# Altium footprint library 7-Connectors-9.PcbLib: 41 footprints (part 2 of 3)
Each footprint in its own frame and in the unit in brackets; x right, y up, seen from the top. Pads: shape width x height; smd on the part's side, far side on the other; paste and mask are expansions set on the pad; w line width, h text height; cw(c..) or ccw(c..) is an arc to the next point about the centre after c.
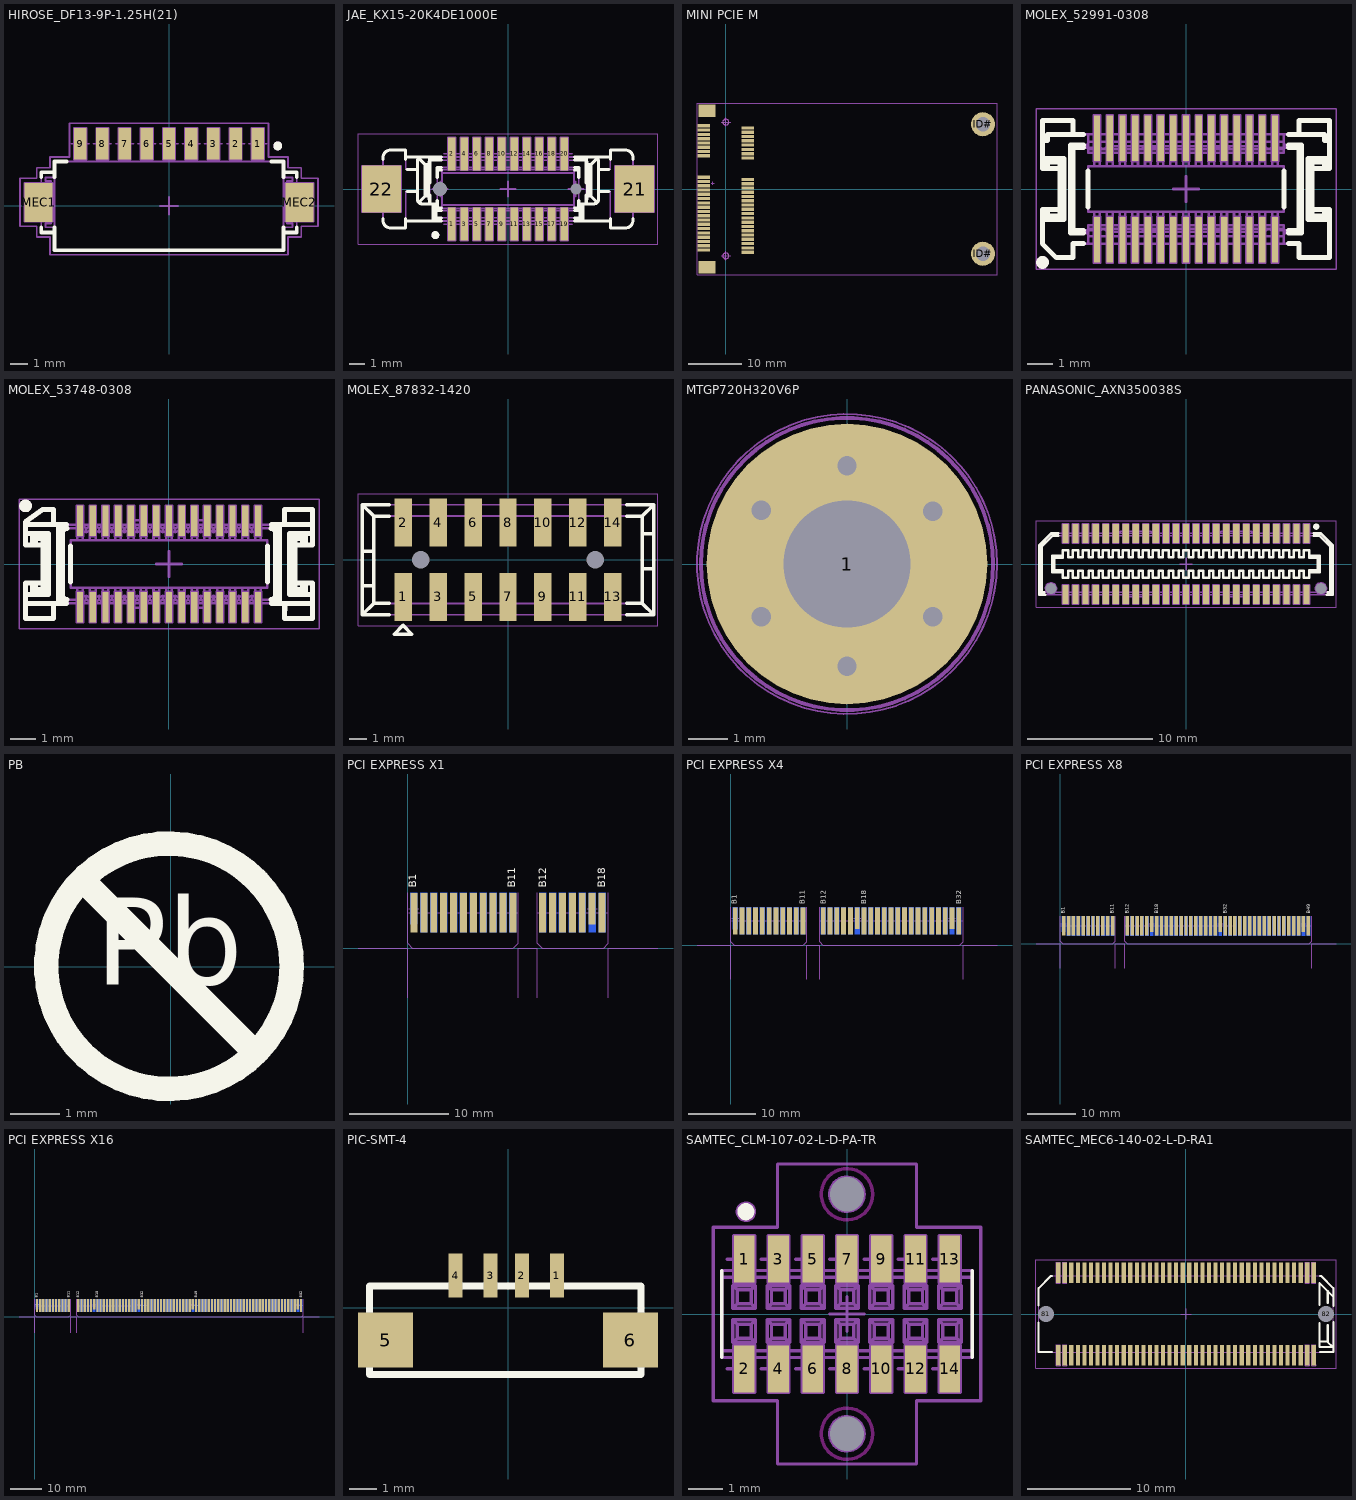
[diagram p1: the footprints below, top view; thin cyan lines are the x and y axes]

## HIROSE_DF13-9P-1.25H(21) [mm] "Pitch 1.25mm, Single Row, 9 Contacts, Right Angle SMT Header, Series DF13"
height 3.6
pads (11):
  rect 0.7x1.8 smd: 1(5,3.5) 2(3.75,3.5) 3(2.5,3.5) 4(1.25,3.5) 5(0,3.5) 6(-1.25,3.5) 7(-2.5,3.5) 8(-3.75,3.5) 9(-5,3.5)
  rect 1.6x2.2 smd: MEC1(-7.35,0.2) MEC2(7.35,0.2)
Top Overlay:
  circle w0.25: c6.125,3.376 r0.125
  lines w0.2: -7.2,-1.2 -7.2,-1.5 -6.45,-1.5 ; -7.2,1.6 -7.2,1.9 -6.45,1.9 ; -6.45,-1.2 -6.45,-2.5 6.45,-2.5 6.45,-1.2 ; -6.45,1.6 -6.45,2.5 -5.75,2.5 ; 5.75,2.5 6.45,2.5 6.45,1.6 ; 6.45,-1.5 7.2,-1.5 7.2,-1.2 ; 6.45,1.9 7.2,1.9 7.2,1.6
Mechanical 8:
  lines w0.1: -7.85,0.2 -7.35,0.2 ; -7.35,-0.3 -7.35,0.2 ; -7.35,0.7 -7.35,0.2 ; -6.85,0.2 -7.35,0.2 ; -5.5,3.5 -5,3.5 ; -5,3 -5,3.5 ; -5,4 -5,3.5 ; -4.5,3.5 -5,3.5 ; -4.25,3.5 -3.75,3.5 ; -3.75,3 -3.75,3.5 ; -3.75,4 -3.75,3.5 ; -3.25,3.5 -3.75,3.5 ; -3,3.5 -2.5,3.5 ; -2.5,3 -2.5,3.5 ; -2.5,4 -2.5,3.5 ; -2,3.5 -2.5,3.5 ; -1.75,3.5 -1.25,3.5 ; -1.25,3 -1.25,3.5 ; -1.25,4 -1.25,3.5 ; -0.75,3.5 -1.25,3.5 ; -0.5,0 0,0 ; -0.5,3.5 0,3.5 ; 0,-0.5 0,0 ; 0,0.5 0,0 ; 0,3 0,3.5 ; 0,4 0,3.5 ; 0.5,0 0,0 ; 0.5,3.5 0,3.5 ; 0.75,3.5 1.25,3.5 ; 1.25,3 1.25,3.5 ; 1.25,4 1.25,3.5 ; 1.75,3.5 1.25,3.5 ; 2,3.5 2.5,3.5 ; 2.5,3 2.5,3.5 ; 2.5,4 2.5,3.5 ; 3,3.5 2.5,3.5 ; 3.25,3.5 3.75,3.5 ; 3.75,3 3.75,3.5 ; 3.75,4 3.75,3.5 ; 4.25,3.5 3.75,3.5 ; 4.5,3.5 5,3.5 ; 5,3 5,3.5 ; 5,4 5,3.5 ; 5.5,3.5 5,3.5 ; 6.85,0.2 7.35,0.2 ; 7.35,-0.3 7.35,0.2 ; 7.35,0.7 7.35,0.2 ; 7.85,0.2 7.35,0.2 ; -8.15,-0.9 -6.55,-0.9 -6.55,1.3 -8.15,1.3 -8.15,-0.9 ; -5.35,2.6 -5.35,4.4 -4.65,4.4 -4.65,2.6 -5.35,2.6 ; -4.1,2.6 -4.1,4.4 -3.4,4.4 -3.4,2.6 -4.1,2.6 ; -2.85,2.6 -2.85,4.4 -2.15,4.4 -2.15,2.6 -2.85,2.6 ; -1.6,2.6 -1.6,4.4 -0.9,4.4 -0.9,2.6 -1.6,2.6 ; -0.35,2.6 -0.35,4.4 0.35,4.4 0.35,2.6 -0.35,2.6 ; 0.9,2.6 0.9,4.4 1.6,4.4 1.6,2.6 0.9,2.6 ; 2.15,2.6 2.15,4.4 2.85,4.4 2.85,2.6 2.15,2.6 ; 3.4,2.6 3.4,4.4 4.1,4.4 4.1,2.6 3.4,2.6 ; 4.65,2.6 4.65,4.4 5.35,4.4 5.35,2.6 4.65,2.6 ; 6.55,-0.9 8.15,-0.9 8.15,1.3 6.55,1.3 6.55,-0.9
Mechanical 14:
  circle w0.25: c6.125,3.376 r0.125
  lines w0.1: -7.2,-0.7 -7.2,-1.5 -6.45,-1.5 ; -7.2,1.1 -7.2,1.9 -6.45,1.9 ; -6.653,1.1 -7.95,1.1 -7.95,-0.7 -6.65,-0.7 ; -6.45,-1.2 -6.95,-1.2 -6.95,-1 -6.65,-1 -6.65,1.4 -6.95,1.4 -6.95,1.6 -6.45,1.6 ; -5.175,2.5 -5.175,3.725 ; -4.825,2.5 -4.825,3.725 ; -3.925,2.5 -3.925,3.725 ; -3.575,2.5 -3.575,3.725 ; -2.675,2.5 -2.675,3.725 ; -2.325,2.5 -2.325,3.725 ; -1.425,2.5 -1.425,3.725 ; -1.075,2.5 -1.075,3.725 ; -0.175,2.5 -0.175,3.725 ; 0.175,2.5 0.175,3.725 ; 1.075,2.5 1.075,3.725 ; 1.425,2.5 1.425,3.725 ; 2.325,2.5 2.325,3.725 ; 2.675,2.5 2.675,3.725 ; 3.575,2.5 3.575,3.725 ; 3.925,2.5 3.925,3.725 ; 4.825,2.5 4.825,3.725 ; 5.175,2.5 5.175,3.725 ; 6.45,-1.5 7.2,-1.5 7.2,-0.7 ; 6.45,-1.2 6.95,-1.2 6.95,-1 6.65,-1 6.65,1.4 6.95,1.4 6.95,1.6 6.45,1.6 ; 6.45,1.9 7.2,1.9 7.2,1.1 ; 6.65,-0.7 7.95,-0.7 7.95,1.1 6.653,1.1 ; -5.175,3.725 -5.075,4 -4.925,4 -4.825,3.725 ; -5.175,3.725 -4.825,3.725 ; -3.925,3.725 -3.825,4 -3.675,4 -3.575,3.725 ; -3.925,3.725 -3.575,3.725 ; -2.675,3.725 -2.575,4 -2.425,4 -2.325,3.725 ; -2.675,3.725 -2.325,3.725 ; -1.425,3.725 -1.325,4 -1.175,4 -1.075,3.725 ; -1.425,3.725 -1.075,3.725 ; -0.175,3.725 -0.075,4 0.075,4 0.175,3.725 ; -0.175,3.725 0.175,3.725 ; 1.075,3.725 1.175,4 1.325,4 1.425,3.725 ; 1.075,3.725 1.425,3.725 ; 2.325,3.725 2.425,4 2.575,4 2.675,3.725 ; 2.325,3.725 2.675,3.725 ; 3.575,3.725 3.675,4 3.825,4 3.925,3.725 ; 3.575,3.725 3.925,3.725 ; 4.825,3.725 4.925,4 5.075,4 5.175,3.725 ; 4.825,3.725 5.175,3.725 ; -6.45,-2.5 6.45,-2.5 6.45,2.5 -6.45,2.5 -6.45,-2.5
Mechanical 15:
  lines w0.1: -8.4,-1.15 -8.4,1.55 -7.45,1.55 -7.45,2.15 -6.7,2.15 -6.7,2.75 -5.6,2.75 -5.6,4.65 5.6,4.65 5.6,2.75 6.7,2.75 6.7,2.15 7.45,2.15 7.45,1.55 8.4,1.55 8.4,-1.15 7.45,-1.15 7.45,-1.75 6.7,-1.75 6.7,-2.75 -6.7,-2.75 -6.7,-1.75 -7.45,-1.75 -7.45,-1.15 -8.4,-1.15
3D body "HIROSE_DF13-9P-1.25H(21).stp": height 3.6, standoff 0, extent -7.95,-2.5 7.95,4

## JAE_KX15-20K4DE1000E [mm] "0.8mm Pitch, 20 Contacts Surface Mount Board to Board & Mezzanine Plug Connector"
height 6.05
pads (24):
  rect 0.5x2.1 smd: 1(-3.6,-2.25) 2(-3.6,2.25) 3(-2.8,-2.25) 4(-2.8,2.25) 5(-2,-2.25) 6(-2,2.25) 7(-1.2,-2.25) 8(-1.2,2.25) 9(-0.4,-2.25) 10(-0.4,2.25) 11(0.4,-2.25) 12(0.4,2.25) 13(1.2,-2.25) 14(1.2,2.25) 15(2,-2.25) 16(2,2.25) 17(2.8,-2.25) 18(2.8,2.25) 19(3.6,-2.25) 20(3.6,2.25)
  rect 2.5x3 smd: 21(8.1,0) 22(-8.1,0)
  round 0.5 hole 0.7 unplated mask+0.1: 23(4.35,0)
  round 0.5 hole 0.9 unplated mask+0.2: 24(-4.35,0)
Top Overlay:
  circle w0.25: c-4.65,-2.95 r0.125
  lines w0.2: -8,-1.9 -8,-2 ccw(c-7.5,-2) -7.5,-2.5 -6.55,-2.5 -6.55,-1.9 ; -8,1.9 -8,2 cw(c-7.5,2) -7.5,2.5 -6.55,2.5 -6.55,1.9 ; -6.55,-2.05 -4.25,-2.05 ; -6.55,2.05 -4.25,2.05 ; -6.45,-0.15 -5.8,-0.15 ; -6.45,1.25 -5.8,1.25 ; -5.712,-0.862 -5.3,-0.45 ; -5.712,1.962 -5.3,1.55 ; -5.5,2.05 ccw(c-5.5,1.75) -5.8,1.75 -5.8,-0.65 ccw(c-5.5,-0.65) -5.5,-0.95 -4.6,-0.95 -4.6,-1.85 ; -5,-0.374 -5,-0.95 -5.1,-0.45 ; -5,0.374 -5,1.85 ; -5,2.05 -5.1,1.55 ; -4.96,2.05 -5,1.85 ; -4.8,-0.95 -4.8,-2.05 -4.6,-1.85 ; -4.525,-0.729 -4.525,-1.375 ; -4.525,0.729 -4.525,1.375 ; -4.25,-1.85 -4.6,-1.85 ; -4.25,-1.375 -4.525,-1.375 ; -4.25,-1.225 -4.502,-1.225 -4.525,-1.375 ; -4.25,1.225 -4.502,1.225 -4.525,1.375 ; -4.25,1.375 -4.525,1.375 ; -4.25,1.85 -5,1.85 ; 4.25,-2.05 6.55,-2.05 ; 4.25,-1.85 4.6,-1.85 ; 4.25,-1.375 4.525,-1.375 ; 4.25,-1.225 4.502,-1.225 4.525,-1.375 ; 4.25,1.225 4.502,1.225 4.525,1.375 ; 4.25,1.375 4.525,1.375 ; 4.25,1.85 5,1.85 ; 4.25,2.05 6.55,2.05 ; 4.525,-0.729 4.525,-1.375 ; 4.525,0.729 4.525,1.375 ; 4.8,-0.95 4.8,-2.05 4.6,-1.85 ; 4.96,2.05 5,1.85 ; 5,-0.374 5,-0.95 5.1,-0.45 ; 5,0.374 5,1.85 ; 5,2.05 5.1,1.55 ; 5.476,2.049 cw(c5.5,1.75) 5.8,1.75 5.8,-0.65 cw(c5.5,-0.65) 5.5,-0.95 4.6,-0.95 4.6,-1.85 ; 5.712,-0.862 5.3,-0.45 ; 5.712,1.962 5.3,1.55 ; 5.8,-0.15 6.45,-0.15 ; 5.8,1.25 6.45,1.25 ; 6.55,-1.9 6.55,-2.5 7.5,-2.5 ccw(c7.5,-2) 8,-2 8,-1.9 ; 6.55,1.9 6.55,2.5 7.5,2.5 cw(c7.5,2) 8,2 8,1.9 ; -5.3,-0.45 -5.3,1.55 ; -5.3,-0.45 -5.1,-0.45 ; -5.3,1.55 -5.1,1.55 ; -5.1,-0.45 -5.1,1.55 ; 5.1,-0.45 5.1,1.55 ; 5.1,-0.45 5.3,-0.45 ; 5.1,1.55 5.3,1.55 ; 5.3,-0.45 5.3,1.55
Mechanical 8:
  drawing of 192 lines, arcs and shapes, not listed
Mechanical 14:
  circle w0.25: c-4.65,-2.95 r0.125
  lines w0.1: -8,-0.95 -8.7,-0.95 -8.7,0.95 -8,0.95 ; -6.55,-2.05 6.55,-2.05 ; -6.55,2.05 6.55,2.05 ; -5.8,-0.15 -6.55,-0.15 -6.55,-2.5 -7.5,-2.5 cw(c-7.5,-2) -8,-2 -8,2 cw(c-7.5,2) -7.5,2.5 -6.55,2.5 -6.55,1.25 -5.8,1.25 ; -5.712,-0.862 -5.3,-0.45 ; -5.712,1.962 -5.3,1.55 ; -5.5,2.05 ccw(c-5.5,1.75) -5.8,1.75 -5.8,-0.65 ccw(c-5.5,-0.65) -5.5,-0.95 -4.6,-0.95 -4.6,-1.85 ; -5,2.05 -5.1,1.55 ; -4.96,2.05 -5,1.85 ; -4.8,-0.95 -4.8,-2.05 -4.6,-1.85 ; -4.225,-1.225 -4.225,1.225 ; -4.225,-1.025 4.225,-1.025 ; -4.225,1.025 4.225,1.025 ; -3.725,-2.05 -3.725,-2.75 -3.475,-2.75 -3.475,-2.05 ; -3.725,2.05 -3.725,2.75 -3.475,2.75 -3.475,2.05 ; -2.925,-2.05 -2.925,-2.75 -2.675,-2.75 -2.675,-2.05 ; -2.925,2.05 -2.925,2.75 -2.675,2.75 -2.675,2.05 ; -2.125,-2.05 -2.125,-2.75 -1.875,-2.75 -1.875,-2.05 ; -2.125,2.05 -2.125,2.75 -1.875,2.75 -1.875,2.05 ; -1.325,-2.05 -1.325,-2.75 -1.075,-2.75 -1.075,-2.05 ; -1.325,2.05 -1.325,2.75 -1.075,2.75 -1.075,2.05 ; -0.525,-2.05 -0.525,-2.75 -0.275,-2.75 -0.275,-2.05 ; -0.525,2.05 -0.525,2.75 -0.275,2.75 -0.275,2.05 ; 0.275,-2.05 0.275,-2.75 0.525,-2.75 0.525,-2.05 ; 0.275,2.05 0.275,2.75 0.525,2.75 0.525,2.05 ; 1.075,-2.05 1.075,-2.75 1.325,-2.75 1.325,-2.05 ; 1.075,2.05 1.075,2.75 1.325,2.75 1.325,2.05 ; 1.875,-2.05 1.875,-2.75 2.125,-2.75 2.125,-2.05 ; 1.875,2.05 1.875,2.75 2.125,2.75 2.125,2.05 ; 2.675,-2.05 2.675,-2.75 2.925,-2.75 2.925,-2.05 ; 2.675,2.05 2.675,2.75 2.925,2.75 2.925,2.05 ; 3.475,-2.05 3.475,-2.75 3.725,-2.75 3.725,-2.05 ; 3.475,2.05 3.475,2.75 3.725,2.75 3.725,2.05 ; 4.225,-1.225 4.225,1.225 ; 4.8,-0.95 4.8,-2.05 4.6,-1.85 ; 4.96,2.05 5,1.85 ; 5,2.05 5.1,1.55 ; 5.476,2.049 cw(c5.5,1.75) 5.8,1.75 5.8,-0.65 cw(c5.5,-0.65) 5.5,-0.95 4.6,-0.95 4.6,-1.85 ; 5.712,-0.862 5.3,-0.45 ; 5.712,1.962 5.3,1.55 ; 5.8,-0.15 6.55,-0.15 6.55,-2.5 7.5,-2.5 ccw(c7.5,-2) 8,-2 8,2 ccw(c7.5,2) 7.5,2.5 6.55,2.5 6.55,1.25 5.8,1.25 ; 8,-0.95 8.7,-0.95 8.7,0.95 8,0.95 ; -5.3,-0.45 -5.3,1.55 ; -5.3,-0.45 -5.1,-0.45 ; -5.3,1.55 -5.1,1.55 ; -5.1,-0.45 -5,-0.95 -5,1.85 ; -5.1,-0.45 -5.1,1.55 ; -5,1.85 5,1.85 ; -4.6,-1.85 4.6,-1.85 ; -4.525,-1.375 -4.502,-1.225 4.502,-1.225 4.525,-1.375 ; -4.525,-1.375 4.525,-1.375 ; -4.525,-1.375 -4.525,1.375 ; -4.525,1.375 -4.502,1.225 4.502,1.225 4.525,1.375 ; -4.525,1.375 4.525,1.375 ; 4.525,-1.375 4.525,1.375 ; 5,1.85 5,-0.95 5.1,-0.45 ; 5.1,-0.45 5.1,1.55 ; 5.1,-0.45 5.3,-0.45 ; 5.1,1.55 5.3,1.55 ; 5.3,-0.45 5.3,1.55
Mechanical 15:
  lines w0.05: -9.6,-3.55 -9.6,3.55 9.6,3.55 9.6,-3.55 -9.6,-3.55
3D body "JAE_KX15-20K4DE1000E.stp": height 5.75, standoff -0.6, extent -8.7,-2.75 8.7,2.75

## MINI PCIE M [mm]
height 2.21
pads (56):
  rect 2.3x0.6 smd mask+0.07: 1(-4.1,11.8) 3(-4.1,11) 4(4.1,10.6) 5(-4.1,10.2) 6(4.1,9.8) 7(-4.1,9.4) 8(4.1,9) 9(-4.1,8.6) 10(4.1,8.2) 11(-4.1,7.8) 12(4.1,7.4) 13(-4.1,7) 14(4.1,6.6) 15(-4.1,6.2) 16(4.1,5.8) 17(-4.1,2.2) 18(4.1,1.8) 19(-4.1,1.4) 20(4.1,1) 21(-4.1,0.6) 22(4.1,0.2) 23(-4.1,-0.2) 24(4.1,-0.6) 25(-4.1,-1) 26(4.1,-1.4) 27(-4.1,-1.8) 28(4.1,-2.2) 29(-4.1,-2.6) 30(4.1,-3) 31(-4.1,-3.4) 32(4.1,-3.8) 33(-4.1,-4.2) 34(4.1,-4.6) 35(-4.1,-5) 36(4.1,-5.4) 37(-4.1,-5.8) 38(4.1,-6.2) 39(-4.1,-6.6) 40(4.1,-7) 41(-4.1,-7.4) 42(4.1,-7.8) 43(-4.1,-8.2) 44(4.1,-8.6) 45(-4.1,-9) 46(4.1,-9.4) 47(-4.1,-9.8) 48(4.1,-10.2) 49(-4.1,-10.6) 50(4.1,-11) 51(-4.1,-11.4) 52(4.1,-11.8)
  rect 2.3x0.6 smd: 2(4.1,11.4)
  round 4.5 hole 2.65 mask+0.07: ID#(48.05,-12.1) ID#(48.05,12.1)
  rect 3.2x2.3 smd mask+0.07: ID##(-3.5,-14.65) ID##(-3.5,14.65)
Top Solder:
  lines w0.254: 0.004,-15.047 5.084,-15.047 5.084,-13.777 ; 0.004,15.027 5.008,15.027 5.008,13.274
Keep-Out Layer:
  circle w0.1: c0,12.5 r0.55
  circle w0.1: c0,-12.5 r0.55
Mechanical 1:
  circle w0.1: c0,12.5 r0.55
  circle w0.1: c0,-12.5 r0.55
Mechanical 15:
  lines w0.025: -0.889,-12.5 0.889,-12.5 ; -0.889,12.5 0.889,12.5 ; 0,-13.322 0,-11.671 ; 0,11.684 0,13.335
  lines w0.1: -5.375,-16.042 50.683,-16.042 50.683,16.043 -5.375,16.043 -5.375,-16.042
Mechanical 16:
  lines w0.203: -2.728,1.049 -2.428,1.049 ; -2.428,0.749 -2.428,1.049 ; -2.428,1.349 -2.428,1.049 ; -2.128,1.049 -2.428,1.049
3D body "0_6-2_3.stp": height 0.02, standoff 0, extent 2.95,1.5 5.25,2.1
3D body "0_6-2_3.stp": height 0.02, standoff 0, extent 2.95,0.7 5.25,1.3
3D body "0_6-2_3.stp": height 0.02, standoff 0, extent 2.95,-0.1 5.25,0.5
3D body "0_6-2_3.stp": height 0.02, standoff 0, extent 2.95,-0.9 5.25,-0.3
3D body "0_6-2_3.stp": height 0.02, standoff 0, extent 2.95,-1.7 5.25,-1.1
3D body "0_6-2_3.stp": height 0.02, standoff 0, extent 2.95,-2.5 5.25,-1.9
3D body "0_6-2_3.stp": height 0.02, standoff 0, extent 2.95,-3.3 5.25,-2.7
3D body "0_6-2_3.stp": height 0.02, standoff 0, extent 2.95,-4.1 5.25,-3.5
3D body "0_6-2_3.stp": height 0.02, standoff 0, extent 2.95,-4.9 5.25,-4.3
3D body "0_6-2_3.stp": height 0.02, standoff 0, extent 2.95,-5.7 5.25,-5.1
3D body "0_6-2_3.stp": height 0.02, standoff 0, extent 2.95,-6.5 5.25,-5.9
3D body "0_6-2_3.stp": height 0.02, standoff 0, extent 2.95,-7.3 5.25,-6.7
3D body "0_6-2_3.stp": height 0.02, standoff 0, extent 2.95,-8.1 5.25,-7.5
3D body "0_6-2_3.stp": height 0.02, standoff 0, extent 2.95,-8.9 5.25,-8.3
3D body "0_6-2_3.stp": height 0.02, standoff 0, extent 2.95,-9.7 5.25,-9.1
3D body "0_6-2_3.stp": height 0.02, standoff 0, extent 2.95,-10.5 5.25,-9.9
3D body "0_6-2_3.stp": height 0.02, standoff 0, extent 2.95,-11.3 5.25,-10.7
3D body "0_6-2_3.stp": height 0.02, standoff 0, extent 2.95,-12.1 5.25,-11.5
3D body "0_6-2_3.stp": height 0.02, standoff 0, extent -5.25,-11.7 -2.95,-11.1
3D body "0_6-2_3.stp": height 0.02, standoff 0, extent -5.25,-10.9 -2.95,-10.3
3D body "0_6-2_3.stp": height 0.02, standoff 0, extent -5.25,-10.1 -2.95,-9.5
3D body "0_6-2_3.stp": height 0.02, standoff 0, extent -5.25,-9.3 -2.95,-8.7
3D body "0_6-2_3.stp": height 0.02, standoff 0, extent -5.25,-8.5 -2.95,-7.9
3D body "0_6-2_3.stp": height 0.02, standoff 0, extent -5.25,-7.7 -2.95,-7.1
3D body "0_6-2_3.stp": height 0.02, standoff 0, extent -5.25,-6.9 -2.95,-6.3
3D body "0_6-2_3.stp": height 0.02, standoff 0, extent -5.25,-6.1 -2.95,-5.5
3D body "0_6-2_3.stp": height 0.02, standoff 0, extent -5.25,-5.3 -2.95,-4.7
3D body "0_6-2_3.stp": height 0.02, standoff 0, extent -5.25,-4.5 -2.95,-3.9
3D body "0_6-2_3.stp": height 0.02, standoff 0, extent -5.25,-3.7 -2.95,-3.1
3D body "0_6-2_3.stp": height 0.02, standoff 0, extent -5.25,-2.9 -2.95,-2.3
3D body "0_6-2_3.stp": height 0.02, standoff 0, extent -5.25,-2.1 -2.95,-1.5
3D body "0_6-2_3.stp": height 0.02, standoff 0, extent -5.25,-1.3 -2.95,-0.7
3D body "0_6-2_3.stp": height 0.02, standoff 0, extent -5.25,-0.5 -2.95,0.1
3D body "0_6-2_3.stp": height 0.02, standoff 0, extent -5.25,0.3 -2.95,0.9
3D body "0_6-2_3.stp": height 0.02, standoff 0, extent -5.25,1.1 -2.95,1.7
3D body "0_6-2_3.stp": height 0.02, standoff 0, extent -5.25,1.9 -2.95,2.5
3D body "0_6-2_3.stp": height 0.02, standoff 0, extent -5.25,5.9 -2.95,6.5
3D body "0_6-2_3.stp": height 0.02, standoff 0, extent -5.25,6.7 -2.95,7.3
3D body "0_6-2_3.stp": height 0.02, standoff 0, extent -5.25,7.5 -2.95,8.1
3D body "0_6-2_3.stp": height 0.02, standoff 0, extent -5.25,8.3 -2.95,8.9
3D body "0_6-2_3.stp": height 0.02, standoff 0, extent -5.25,9.1 -2.95,9.7
3D body "0_6-2_3.stp": height 0.02, standoff 0, extent -5.25,9.9 -2.95,10.5
3D body "0_6-2_3.stp": height 0.02, standoff 0, extent -5.25,10.7 -2.95,11.3
3D body "0_6-2_3.stp": height 0.02, standoff 0, extent -5.25,11.5 -2.95,12.1
3D body "0_6-2_3.stp": height 0.02, standoff 0, extent 2.95,11.1 5.25,11.7
3D body "0_6-2_3.stp": height 0.02, standoff 0, extent 2.95,10.3 5.25,10.9
3D body "0_6-2_3.stp": height 0.02, standoff 0, extent 2.95,9.5 5.25,10.1
3D body "0_6-2_3.stp": height 0.02, standoff 0, extent 2.95,8.7 5.25,9.3
3D body "0_6-2_3.stp": height 0.02, standoff 0, extent 2.95,7.9 5.25,8.5
3D body "0_6-2_3.stp": height 0.02, standoff 0, extent 2.95,7.1 5.25,7.7
3D body "0_6-2_3.stp": height 0.02, standoff 0, extent 2.95,6.3 5.25,6.9
3D body "0_6-2_3.stp": height 0.02, standoff 0, extent 2.95,5.5 5.25,6.1
3D body "0_6-2_3.stp": height 0.02, standoff 0, extent -5.101,13.506 -4.501,15.806
3D body "0_6-2_3.stp": height 0.02, standoff 0, extent -4.491,13.506 -3.891,15.806
3D body "0_6-2_3.stp": height 0.02, standoff 0, extent -3.881,13.506 -3.281,15.806
3D body "0_6-2_3.stp": height 0.02, standoff 0, extent -3.272,13.506 -2.672,15.806
3D body "0_6-2_3.stp": height 0.02, standoff 0, extent -2.662,13.506 -2.062,15.806
3D body "0_6-2_3.stp": height 0.02, standoff 0, extent -2.51,13.506 -1.91,15.806
3D body "0_6-2_3.stp": height 0.02, standoff 0, extent -5.101,-15.806 -4.501,-13.506
3D body "0_6-2_3.stp": height 0.02, standoff 0, extent -4.542,-15.806 -3.942,-13.506
3D body "0_6-2_3.stp": height 0.02, standoff 0, extent -3.983,-15.806 -3.383,-13.506
3D body "0_6-2_3.stp": height 0.02, standoff 0, extent -3.399,-15.806 -2.799,-13.506
3D body "0_6-2_3.stp": height 0.02, standoff 0, extent -2.799,-15.806 -2.199,-13.506
3D body "0_6-2_3.stp": height 0.02, standoff 0, extent -2.484,-15.806 -1.884,-13.506

## MOLEX_52991-0308 [mm] "0.50mm Pitch SlimStack?Dual Row 30 Circuits Surface Mount Vertical Receptacle (3.00 and 4.00mm Stacking Heights)"
height 2.27
pads (30):
  rect 0.25x1.8 smd: 1(-3.5,-2) 2(-3.5,2) 3(-3,-2) 4(-3,2) 5(-2.5,-2) 6(-2.5,2) 7(-2,-2) 8(-2,2) 9(-1.5,-2) 10(-1.5,2) 11(-1,-2) 12(-1,2) 13(-0.5,-2) 14(-0.5,2) 15(0,-2) 16(0,2) 17(0.5,-2) 18(0.5,2) 19(1,-2) 20(1,2) 21(1.5,-2) 22(1.5,2) 23(2,-2) 24(2,2) 25(2.5,-2) 26(2.5,2) 27(3,-2) 28(3,2) 29(3.5,-2) 30(3.5,2)
Top Overlay:
  circle w0.25: c-5.644,-2.889 r0.125
  lines w0.2: -5.65,-1.2 -4.81,-1.2 -4.81,1.2 -5.65,1.2 ; -5.65,1.9 -5.45,1.9 -5.45,2.15 -4.45,2.15 ; -5.525,-0.8 -5.525,-1.135 ; -5.525,0.8 -5.525,1.135 ; -5.45,-0.8 -5.45,-1.06 ; -5.45,0.8 -5.45,1.06 ; -4.025,-2.15 -4.45,-2.15 -4.45,-2.7 -5.1,-2.7 -5.65,-2.15 -5.65,-0.8 -4.95,-0.8 ; -4.025,-1.73 -4.55,-1.73 ; -4.025,-1.63 -4.45,-1.63 ; -4.025,1.63 -4.45,1.63 ; -4.025,1.73 -4.55,1.73 ; -4.025,2.15 -4.45,2.15 ; -3.85,-0.7 -3.85,0.7 ; 3.85,-0.7 3.85,0.7 ; 4.025,-2.15 4.45,-2.15 4.45,-2.7 5.65,-2.7 5.65,-0.8 ; 4.025,-1.73 4.55,-1.73 ; 4.025,-1.63 4.45,-1.63 ; 4.025,1.63 4.45,1.63 ; 4.025,1.73 4.55,1.73 ; 4.025,2.15 4.45,2.15 ; 5.45,-0.8 5.45,-1.06 ; 5.45,0.8 5.45,1.06 ; 5.525,-0.8 5.525,-1.135 ; 5.525,0.8 5.525,1.135 ; 5.65,-1.2 4.81,-1.2 4.81,1.2 5.65,1.2 ; 5.65,1.9 5.45,1.9 5.45,2.15 4.45,2.15 ; -5.525,-1.135 -4.875,-1.135 ; -5.525,-1.135 -5.45,-1.06 ; -5.525,1.135 -4.875,1.135 ; -5.525,1.135 -5.45,1.06 ; -5.45,-1.06 -4.95,-1.06 ; -5.45,1.06 -4.95,1.06 ; -4.95,-1.06 -4.95,-0.8 ; -4.95,-1.06 -4.875,-1.135 ; -4.95,-0.8 -4.95,0.8 ; -4.95,0.8 -5.65,0.8 -5.65,2.7 -4.45,2.7 -4.45,2.15 ; -4.95,0.8 -4.95,1.06 ; -4.95,1.06 -4.875,1.135 ; -4.875,-1.135 -4.875,1.135 ; -4.55,-1.73 -4.45,-1.63 ; -4.55,-1.73 -4.55,1.73 ; -4.55,1.73 -4.45,1.63 ; -4.45,-1.63 -4.45,1.63 ; 4.45,-1.63 4.55,-1.73 ; 4.45,-1.63 4.45,1.63 ; 4.45,1.63 4.55,1.73 ; 4.45,2.15 4.45,2.7 5.65,2.7 5.65,0.8 ; 4.55,-1.73 4.55,1.73 ; 4.875,-1.135 5.525,-1.135 ; 4.875,-1.135 4.95,-1.06 ; 4.875,-1.135 4.875,1.135 ; 4.875,1.135 5.525,1.135 ; 4.875,1.135 4.95,1.06 ; 4.95,-1.06 4.95,-0.8 ; 4.95,-1.06 5.45,-1.06 ; 4.95,-0.8 4.95,0.8 ; 4.95,-0.8 5.65,-0.8 ; 4.95,-0.8 5.65,-0.8 ; 4.95,0.8 5.65,0.8 ; 4.95,0.8 5.65,0.8 ; 4.95,0.8 4.95,1.06 ; 4.95,1.06 5.45,1.06 ; 5.45,-1.06 5.525,-1.135 ; 5.45,1.06 5.525,1.135
Mechanical 8:
  drawing of 184 lines, arcs and shapes, not listed
Mechanical 14:
  drawing of 228 lines, arcs and shapes, not listed
Mechanical 15:
  lines w0.05: -5.9,-3.15 -5.9,3.15 5.9,3.15 5.9,-3.15 -5.9,-3.15